# Altium footprint library eLIB.PcbLib: 206 footprints (part 4 of 13)
Each footprint in its own frame and in the unit in brackets; x right, y up, seen from the top. Pads: shape width x height; smd on the part's side, far side on the other; paste and mask are expansions set on the pad; w line width, h text height; cw(c..) or ccw(c..) is an arc to the next point about the centre after c.
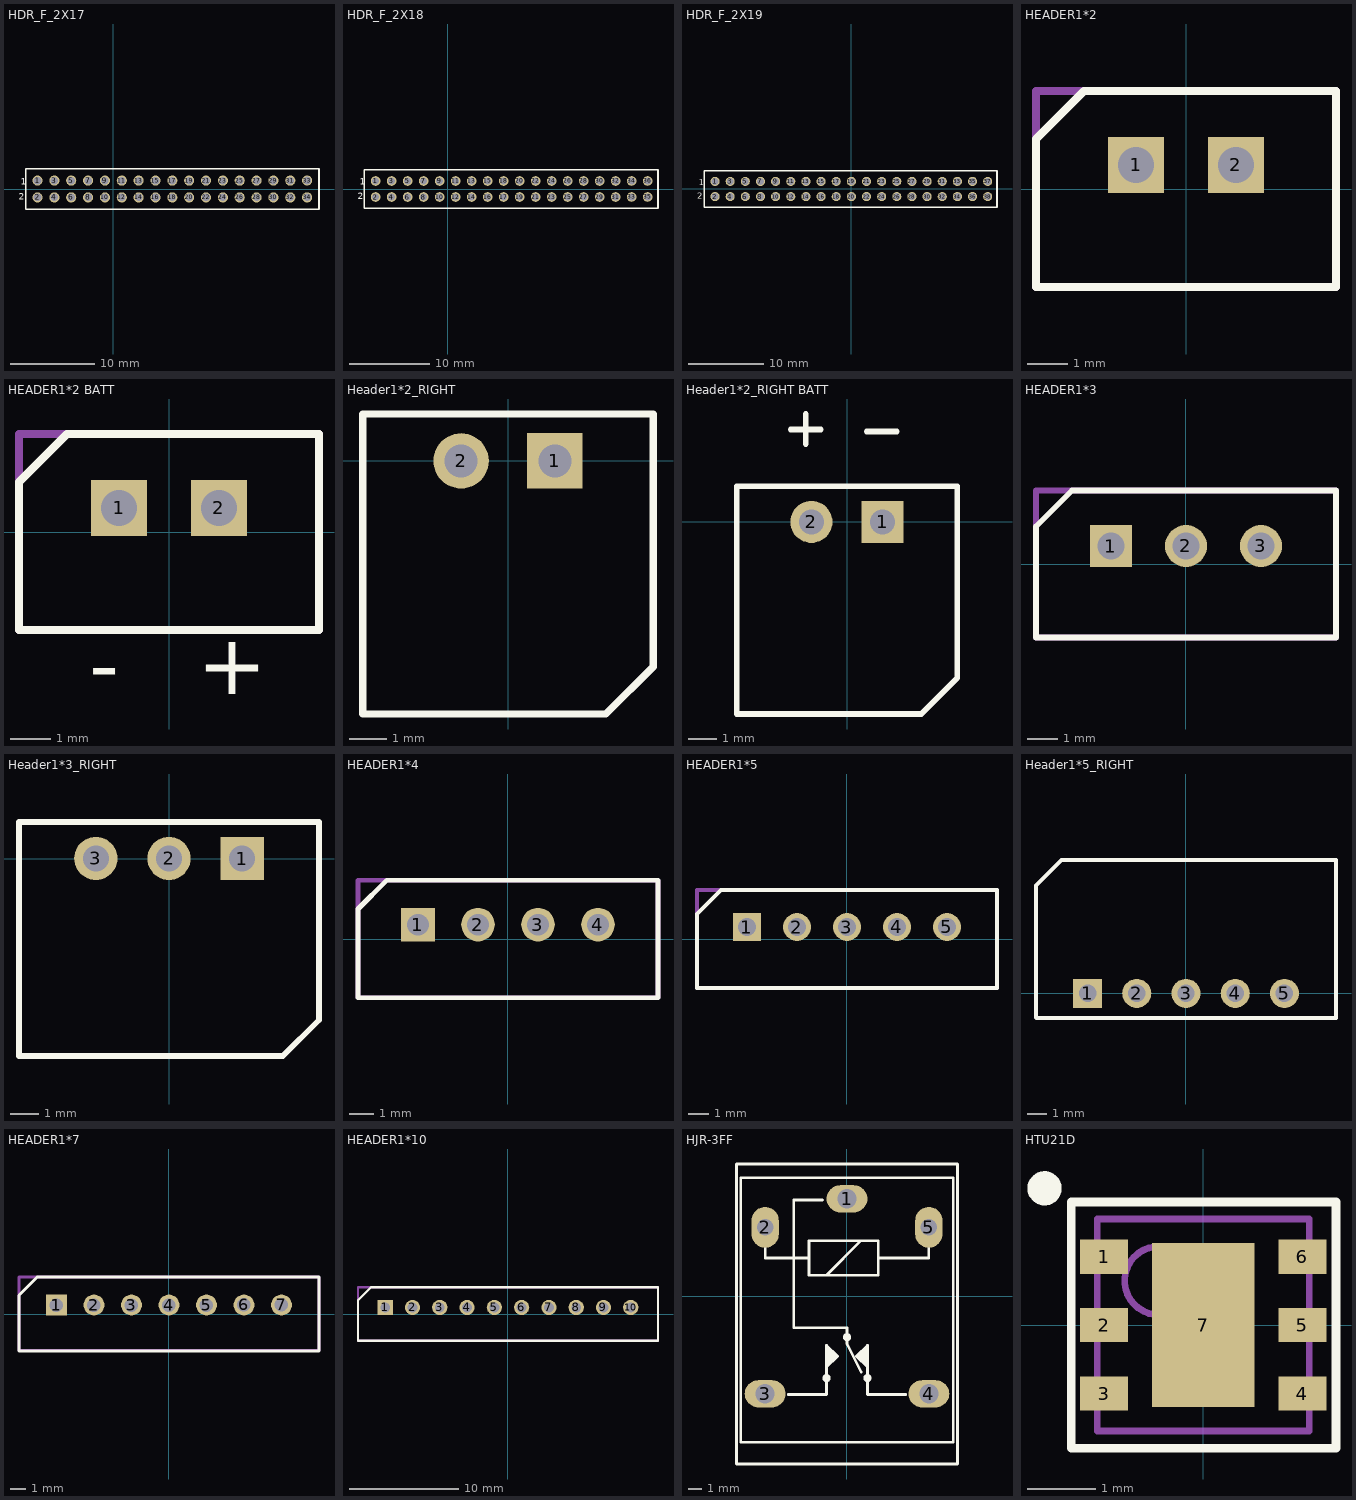
[diagram p3: the footprints below, top view; thin cyan lines are the x and y axes]

## HDR_F_2X17 [mm] "Connector; Header; 2mm Pitch"
pads (34):
  round 1.2 / inner round 1.2 / far side oval 1.2x1.6 hole 0.9: 1(-9,1) 2(-9,-1) 3(-7,1) 4(-7,-1) 5(-5,1) 6(-5,-1) 7(-3,1) 8(-3,-1) 9(-1,1) 10(-1,-1) 11(1,1) 12(1,-1) 13(3,1) 14(3,-1) 15(5,1) 16(5,-1) 17(7,1) 18(7,-1) 19(9,1) 20(9,-1) 21(11,1) 22(11,-1) 23(13,1) 24(13,-1) 25(15,1) 26(15,-1) 27(17,1) 28(17,-1) 29(19,1) 30(19,-1) 31(21,1) 32(21,-1) 33(22.999,1.005) 34(22.999,-0.995)
Top Overlay:
  lines w0.2: 5.6,-2.4 24.41,-2.4 24.41,2.4 5.6,2.4 ; 8.42,-2.4 -10.4,-2.4 -10.4,2.4 8.42,2.4
  text "2" at -11.2,-1.3 h0.8
  text "1" at -11,0.5 h0.8
3D body "female_header_a-bl200-dg-g20d.stp": height 4, standoff -2.8, extent -10.25,-2.25 10.25,2.25
3D body "female_header_a-bl200-dg-g06d.stp": height 4, standoff -2.8, extent 9.75,-2.25 16.25,2.25
3D body "female_header_a-bl200-dg-g06d.stp": height 4, standoff -2.8, extent 15.76,-2.25 22.26,2.25
3D body "female_header_a-bl200-dg-g06d.stp": height 4, standoff -2.8, extent 17.77,-2.25 24.27,2.25

## HDR_F_2X18 [mm] "Connector; Header; 2mm Pitch"
pads (36):
  round 1.2 / inner round 1.2 / far side oval 1.2x1.6 hole 0.9: 1(-9,1) 2(-9,-1) 3(-7,1) 4(-7,-1) 5(-5,1) 6(-5,-1) 7(-3,1) 8(-3,-1) 9(-1,1) 10(-1,-1) 11(1,1) 12(1,-1) 13(3,1) 14(3,-1) 15(5,1) 16(5,-1) 17(7,-1) 18(7,1) 19(9,-1) 20(9,1) 21(11,-1) 22(11,1) 23(13,-1) 24(13,1) 25(15,-1) 26(15,1) 27(17,-1) 28(17,1) 29(19,-1) 30(19,1) 31(21,-1) 32(21,1) 33(22.999,-0.995) 34(22.999,1.005) 35(24.999,-0.995) 36(24.999,1.005)
Top Overlay:
  lines w0.2: 5.6,-2.4 26.29,-2.4 26.29,2.4 5.6,2.4 ; 8.42,-2.4 -10.4,-2.4 -10.4,2.4 8.42,2.4
  text "2" at -11.2,-1.3 h0.8
  text "1" at -11,0.5 h0.8
3D body "female_header_a-bl200-dg-g20d.stp": height 4, standoff -2.8, extent 5.65,-2.26 26.15,2.24
3D body "female_header_a-bl200-dg-g20d.stp": height 4, standoff -2.8, extent -10.25,-2.25 10.25,2.25

## HDR_F_2X19 [mm]
pads (38):
  round 1.2 / inner round 1.2 / far side oval 1.2x1.6 hole 0.9: 1(-18,0.998) 2(-18,-1.002) 3(-16,0.998) 4(-16,-1.002) 5(-14,0.998) 6(-14,-1.002) 7(-12,0.998) 8(-12,-1.002) 9(-10,0.998) 10(-10,-1.002) 11(-8,0.998) 12(-8,-1.002) 13(-6,0.998) 14(-6,-1.002) 15(-4,0.998) 16(-4,-1.002) 17(-2,0.998) 18(-2,-1.002) 19(0,0.998) 20(0,-1.002) 21(2,0.998) 22(2,-1.002) 23(4,0.998) 24(4,-1.002) 25(6,0.998) 26(6,-1.002) 27(8,0.998) 28(8,-1.002) 29(10,0.998) 30(10,-1.002) 31(12,0.998) 32(12,-1.002) 33(13.999,1.002) 34(13.999,-0.998) 35(15.999,1.002) 36(15.999,-0.998) 37(18,0.998) 38(18,-1.002)
Top Overlay:
  lines w0.2: -3.4,-2.402 19.23,-2.402 19.23,2.398 -3.4,2.398 ; -0.58,-2.402 -19.4,-2.402 -19.4,2.398 -0.58,2.398
  text "1" at -20.183,0.498 h0.8
  text "2" at -20.383,-1.302 h0.8
3D body "female_header_a-bl200-dg-g20d.stp": height 4, standoff -2.8, extent -1.39,-2.261 19.11,2.239
3D body "female_header_a-bl200-dg-g20d.stp": height 4, standoff -2.8, extent -19.25,-2.252 1.25,2.248
3D body "female_header_a-bl200-dg-g20d.stp": height 4, standoff -2.8, extent -3.35,-2.262 17.15,2.237

## HEADER1*2 [mm] "2.50mm Male Shrouded Header, 2p"
height 5.9
pads (2):
  rect 1.4x1.4 hole 0.9: 1(-1.25,0.6) 2(1.25,0.6)
Top Overlay:
  lines w0.2: -3.75,-2.45 -3.75,1.25 -2.55,2.45 3.75,2.45 3.75,-2.45 -3.75,-2.45
Mechanical 13:
  lines w0.2: -3.75,-2.45 -3.75,2.45 3.75,2.45 3.75,-2.45 -3.75,-2.45
3D body "64600211622.stp": height 5.95, standoff -3.45, extent -3.75,-2.45 3.75,2.45

## HEADER1*2 BATT [mm] "2.50mm Male Shrouded Header, 2p BATTERY PACK"
height 5.9
pads (2):
  rect 1.4x1.4 hole 0.9: 1(-1.25,0.6) 2(1.25,0.6)
Top Overlay:
  lines w0.2: -3.75,-2.45 -3.75,1.25 -2.55,2.45 3.75,2.45 3.75,-2.45 -3.75,-2.45
  text "+" at 0.71,-4.05 h1.52
  text "-" at -1.99,-4.05 h1.52
Mechanical 13:
  lines w0.2: -3.75,-2.45 -3.75,2.45 3.75,2.45 3.75,-2.45 -3.75,-2.45
3D body "64600211622.stp": height 5.95, standoff -3.45, extent -3.75,-2.45 3.75,2.45

## Header1*2_RIGHT [mm] "2.50mm  Pitch Mini-SPOX Wire-to-Board Crimp Housing, Friction Lock, 2 Circuits, Right male"
pads (2):
  rect 1.5x1.5 hole 0.9: 1(1.27,0)
  round 1.5 hole 0.9: 2(-1.27,0)
Top Overlay:
  lines w0.2: -3.937,-6.858 -3.937,1.27 3.937,1.27 3.937,-5.573 2.652,-6.858 2.61,-6.858 -3.937,-6.858

## Header1*2_RIGHT BATT [mm] "2.50mm  Pitch Mini-SPOX Wire-to-Board Crimp Housing, Friction Lock, 2 Circuits, Right male"
pads (2):
  rect 1.5x1.5 hole 0.9: 1(1.27,0)
  round 1.5 hole 0.9: 2(-1.27,0)
Top Overlay:
  lines w0.2: -2.005,3.3 -0.935,3.3 ; -1.47,2.785 -1.47,3.855 ; 0.7,3.23 1.77,3.23 ; -3.937,-6.858 -3.937,1.27 3.937,1.27 3.937,-5.573 2.652,-6.858 2.61,-6.858 -3.937,-6.858
3D body "64600211622.stp": height 4.95, standoff 0.05, extent -3.75,-6.71 3.75,2.69

## HEADER1*3 [mm] "2.50mm Male Shrouded Header, 3p"
height 5.9
pads (3):
  rect 1.4x1.4 hole 0.9: 1(-2.5,0.6)
  round 1.4 hole 0.9: 2(0,0.6) 3(2.5,0.6)
Top Overlay:
  lines w0.2: -3.8,2.45 -5,1.25 -5,-2.45 5,-2.45 5,2.45 -3.75,2.45
Mechanical 13:
  lines w0.2: -5,-2.45 -5,2.45 5,2.45 5,-2.45 -5,-2.45
3D body "64600311622.stp": height 5.95, standoff -3.45, extent -5,-2.45 5,2.45

## Header1*3_RIGHT [mm] "2.50mm  Pitch Mini-SPOX Wire-to-Board Crimp Housing, Friction Lock, 3 Circuits, Right male"
pads (3):
  rect 1.5x1.5 hole 0.9: 1(2.54,-0.001)
  round 1.5 hole 0.9: 2(0,0.002) 3(-2.54,0.002)
Top Overlay:
  lines w0.2: -5.207,-6.858 3.952,-6.858 5.207,-5.603 5.207,1.272 -5.207,1.272 -5.207,-6.858

## HEADER1*4 [mm] "2.50mm Male Shrouded Header, 4p"
height 5.9
pads (4):
  rect 1.4x1.4 hole 0.9: 1(-3.75,0.6)
  round 1.4 hole 0.9: 2(-1.25,0.6) 3(1.25,0.6) 4(3.75,0.6)
Top Overlay:
  lines w0.2: -5.05,2.45 -6.25,1.25 -6.25,-2.45 6.25,-2.45 6.25,2.45 -5,2.45
Mechanical 13:
  lines w0.2: -6.25,-2.45 -6.25,2.45 6.25,2.45 6.25,-2.45 -6.25,-2.45
3D body "64600411622.stp": height 5.95, standoff -3.45, extent -6.25,-2.45 6.25,2.45

## HEADER1*5 [mm] "2.50mm Male Shrouded Header, 5p"
height 5.9
pads (5):
  rect 1.4x1.4 hole 0.9: 1(-5,0.6)
  round 1.4 hole 0.9: 2(-2.5,0.6) 3(0,0.6) 4(2.5,0.6) 5(5,0.6)
Top Overlay:
  lines w0.2: 7.5,-2.45 -7.5,-2.45 -7.5,1.25 -6.3,2.45 7.5,2.45 7.5,-2.45
Mechanical 13:
  lines w0.2: -7.5,-2.45 -7.5,2.45 7.5,2.45 7.5,-2.45 -7.5,-2.45
3D body "64600511622.stp": height 5.95, standoff -3.45, extent -7.5,-2.45 7.5,2.45

## Header1*5_RIGHT [mm] "2.50mm  Pitch Mini-SPOX Wire-to-Board Crimp Housing, Friction Lock, 5 Circuits, Right male"
pads (5):
  rect 1.5x1.5 hole 0.9: 1(-5.08,0)
  round 1.5 hole 0.9: 2(-2.54,0) 3(0,0) 4(2.54,0) 5(5.08,0)
Top Overlay:
  lines w0.2: -7.74,-1.26 -7.74,5.57 -6.432,6.878 7.74,6.878 7.74,-1.27 -7.73,-1.27 ; -7.717,5.603 -6.462,6.858

## HEADER1*7 [mm] "2.50mm Male Shrouded Header, 7p"
height 5.9
pads (7):
  rect 1.4x1.4 hole 0.9: 1(-7.5,0.6)
  round 1.4 hole 0.9: 2(-5,0.6) 3(-2.5,0.6) 4(0,0.6) 5(2.5,0.6) 6(5,0.6) 7(7.5,0.6)
Top Overlay:
  lines w0.2: -10,-2.45 -10,1.25 -8.8,2.45 10,2.45 10,-2.45 -10,-2.45
Mechanical 13:
  lines w0.2: -10,-2.45 10,-2.45 10,2.45 -10,2.45 -10,-2.45
3D body "64600711622.stp": height 5.95, standoff -3.45, extent -10,-2.45 10,2.45

## HEADER1*10 [mm] "2.50mm Male Shrouded Header, 10p"
height 5.9
pads (10):
  rect 1.4x1.4 hole 0.9: 1(-11.25,0.6)
  round 1.4 hole 0.9: 2(-8.75,0.6) 3(-6.25,0.6) 4(-3.75,0.6) 5(-1.25,0.6) 6(1.25,0.6) 7(3.75,0.6) 8(6.25,0.6) 9(8.75,0.6) 10(11.25,0.6)
Top Overlay:
  lines w0.2: -13.75,-2.45 13.75,-2.45 13.75,2.45 -12.55,2.45 -13.75,1.25 -13.75,-2.45
Mechanical 13:
  lines w0.2: -13.75,-2.45 -13.75,2.45 13.75,2.45 13.75,-2.45 -13.75,-2.45
3D body "64601011622.stp": height 5.95, standoff -3.45, extent -13.75,-2.45 13.75,2.45

## HJR-3FF [mm] "RELAY 7AAC"
pads (5):
  oval 3x2 hole 1.4: 1(0,7.15) 3(-6,-7.15) 4(6,-7.15)
  oval 2x3 hole 1.2: 2(-6,5.05) 5(6,5.05)
Top Overlay:
  circle w0.2: c0,-3 r0.2
  circle w0.2: c1.5,-6 r0.2
  circle w0.2: c-1.5,-6 r0.2
  region: 1.5,-3.6 1.5,-5.2 0.7,-4.4
  region: -1.5,-3.6 -1.5,-5.2 -0.7,-4.4
  lines w0.2: -6,3.75 -6,2.808 -2.794,2.808 ; -4.3,-7.2 -1.5,-7.2 -1.5,-3.6 -0.7,-4.4 -1.5,-5.2 ; -1.8,7.062 -3.9,7.062 -3.9,-2.3 0,-2.3 0,-3.5 0.016,-3.532 0.02,-3.52 1.04,-5.56 ; -1.524,1.538 1.016,4.078 ; 1.5,-5.2 0.7,-4.4 1.5,-3.6 1.5,-7.2 4.3,-7.2 ; 6,3.75 6,2.808 2.286,2.808 ; 2.286,2.808 2.286,1.538 -2.794,1.538 -2.794,4.078 2.286,4.078 2.286,2.808 ; -8.1,-12.3 8.1,-12.3 8.1,9.7 -8.1,9.7 -8.1,-12.3 ; -7.8,-10.7 7.8,-10.7 7.8,8.7 -7.8,8.7 -7.8,-10.7
3D body "User Library-RELE.step": height 15.5, standoff -2.5, extent -7.95,-10.7 7.95,8.8

## HTU21D [mm] "PQFN, 6-Leads, Body 3.00x3.00mm, Pitch 1.00mm, Thermal Pad 1.50x2.40mm, IPC Medium Density"
height 0.9
pads (7):
  rect 0.7x0.5 smd: 1(-1.45,1) 2(-1.45,0) 3(-1.45,-1) 4(1.45,-1) 5(1.45,0) 6(1.45,1)
  rect 1.5x2.4 smd: 7(0,0)
Top Overlay:
  circle w0.25: c-2.32,2 r0.125
  lines w0.127: -1.93,-1.8 -1.93,1.8 1.94,1.8 1.94,-1.8 -1.93,-1.8
Mechanical 13:
  circle w0.1: c-0.65,0.65 r0.5
  lines w0.1: -1.55,-1.55 1.55,-1.55 1.55,1.55 -1.55,1.55 -1.55,-1.55
Mechanical 15:
  lines w0.1: -0.5,0 0.5,0 ; 0,-0.5 0,0.5
3D body "User Library-HTU21.STEP": height 0.9, standoff -0.01, extent -1.501,-1.5 1.501,1.5